# Altium footprint library 元件1.PcbLib: 420 footprints (part 8 of 27)
Each footprint in its own frame and in the unit in brackets; x right, y up, seen from the top. Pads: shape width x height; smd on the part's side, far side on the other; paste and mask are expansions set on the pad; w line width, h text height; cw(c..) or ccw(c..) is an arc to the next point about the centre after c.
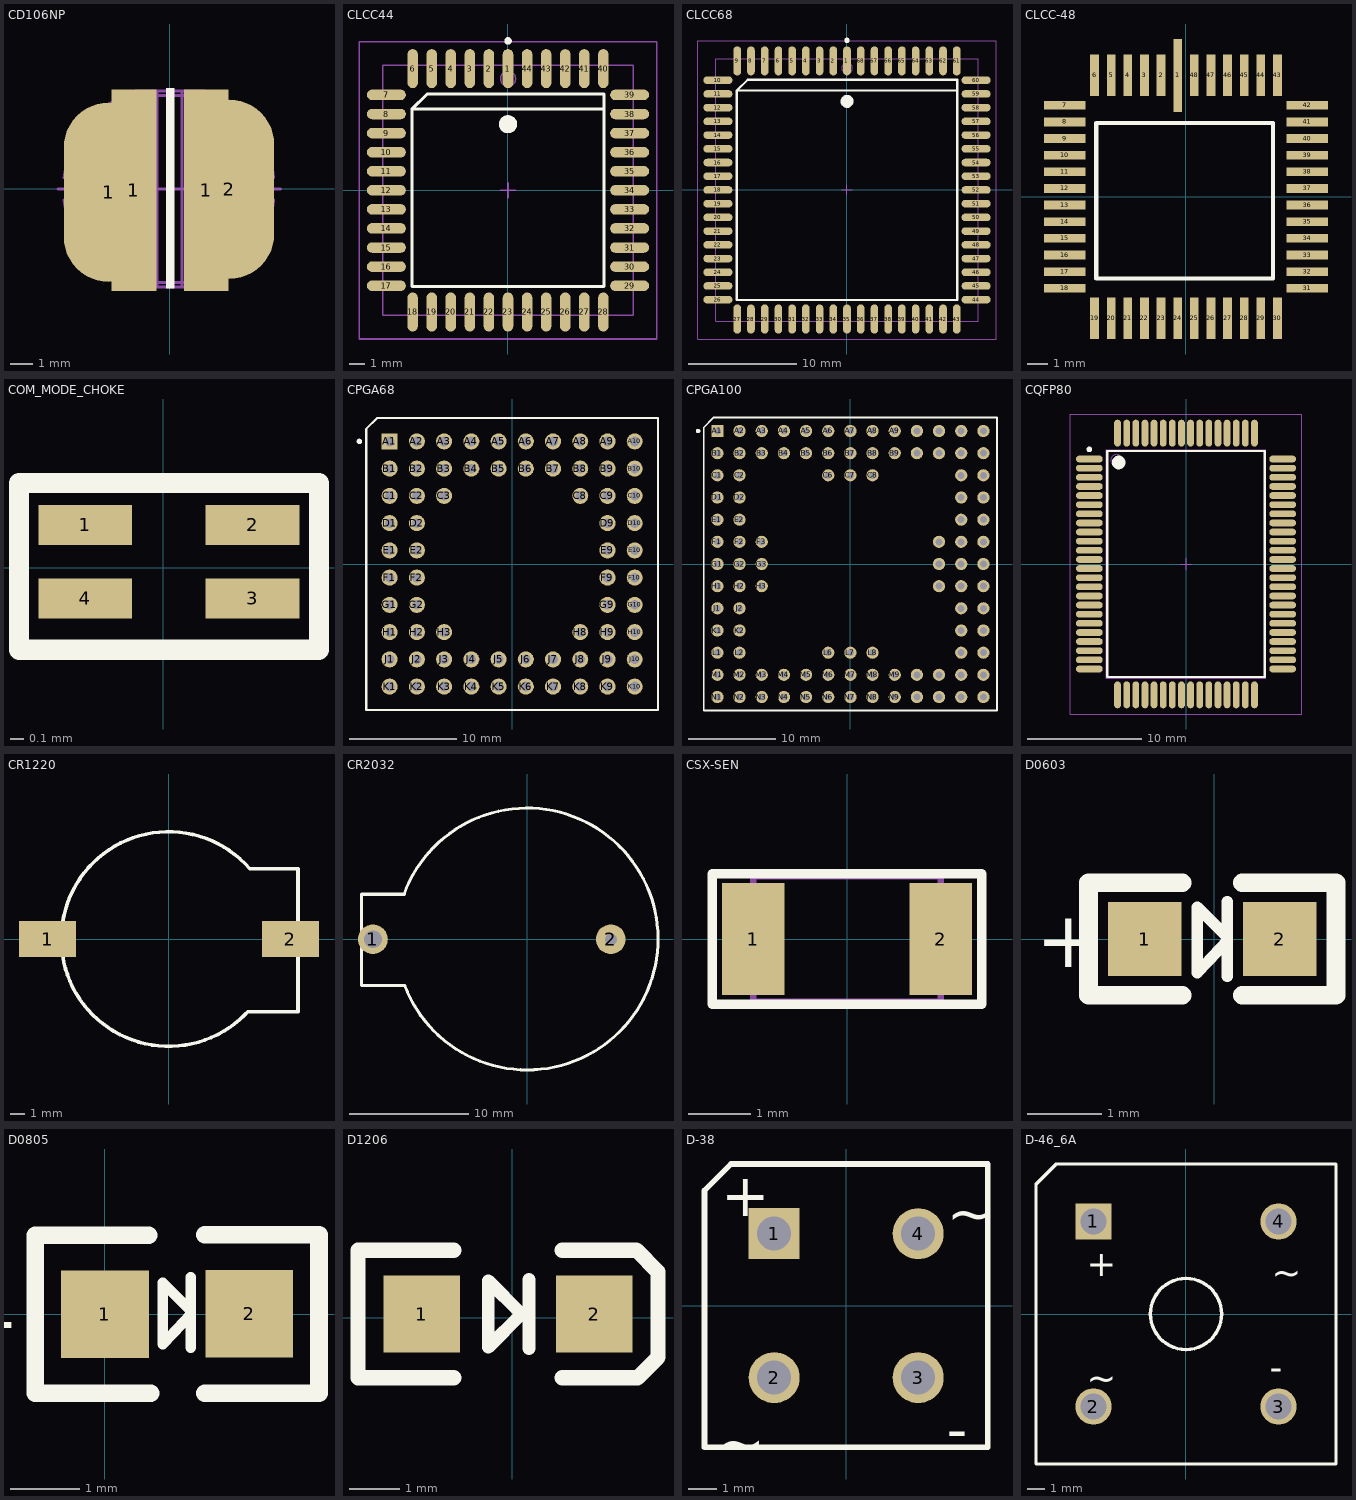
[diagram p7: the footprints below, top view; thin cyan lines are the x and y axes]

## CD106NP [mm]
pads (4):
  oval 4x8 smd mask+0: 1(-2.741,-0.165) 2(2.652,-0.031)
  rect 2x9 smd mask+0: 1(-1.613,-0.082) 1(1.615,-0.082)
Top Overlay:
  rectangle: -0.189,-4.455 0.196,4.487
Mechanical 2:
  lines w0.127: -5.002,-0.017 4.931,-0.017 ; -0.016,-4.17 -0.016,4.264 ; -4.733,-0.515 ccw(c-4.766,-0.016) -4.732,0.483 cw(c-0.018,-0.145) -1.558,4.355 1.524,4.355 cw(c-0.035,-0.079) 4.632,0.483 ccw(c4.665,-0.016) 4.633,-0.515 cw(c-0.035,0.037) 1.523,-4.398 -1.558,-4.398 cw(c-0.017,0.102) -4.733,-0.515 ; -4.508,-0.667 ccw(c-0.017,0.102) -1.524,-4.198 1.489,-4.198 ccw(c-0.035,0.037) 4.41,-0.668 cw(c4.665,-0.016) 4.408,0.635 ccw(c-0.035,-0.079) 1.489,4.155 -1.524,4.155 ccw(c-0.018,-0.145) -4.507,0.634 cw(c-4.766,-0.016) -4.508,-0.667 ; -0.569,-4.398 -0.569,4.355 0.538,4.355 0.538,-4.398 -0.569,-4.398
Mechanical 5:
  text "C10 H6.5 W9 L10" at -2.756,-5.181 h0.4
3D body "CD106.STEP": height 6.5, standoff -0.05, extent -4.671,-4.396 4.695,4.356

## CLCC44 [mm] "44-Pin Leaded Chip Carrier 1.27 mm Pitch, IPC Low Density"
height 2.87
pads (44):
  oval 0.7x2.6 smd: 1(0,8.1) 2(-1.27,8.1) 3(-2.54,8.1) 4(-3.81,8.1) 5(-5.08,8.1) 6(-6.35,8.1) 18(-6.35,-8.1) 19(-5.08,-8.1) 20(-3.81,-8.1) 21(-2.54,-8.1) 22(-1.27,-8.1) 23(0,-8.1) 24(1.27,-8.1) 25(2.54,-8.1) 26(3.81,-8.1) 27(5.08,-8.1) 28(6.35,-8.1) 40(6.35,8.1) 41(5.08,8.1) 42(3.81,8.1) 43(2.54,8.1) 44(1.27,8.1)
  oval 2.6x0.7 smd: 7(-8.1,6.35) 8(-8.1,5.08) 9(-8.1,3.81) 10(-8.1,2.54) 11(-8.1,1.27) 12(-8.1,0) 13(-8.1,-1.27) 14(-8.1,-2.54) 15(-8.1,-3.81) 16(-8.1,-5.08) 17(-8.1,-6.35) 29(8.1,-6.35) 30(8.1,-5.08) 31(8.1,-3.81) 32(8.1,-2.54) 33(8.1,-1.27) 34(8.1,0) 35(8.1,1.27) 36(8.1,2.54) 37(8.1,3.81) 38(8.1,5.08) 39(8.1,6.35)
Top Overlay:
  circle w0.6: c0,4.4 r0.3
  circle w0.25: c0,9.95 r0.125
  lines w0.2: 6.4,5.4 -6.4,5.4 ; -6.4,5.4 -6.4,-6.4 6.4,-6.4 6.4,6.4 -5.4,6.4 -6.4,5.4
Mechanical 13:
  circle w0.1: c0,7.43 r0.5
  lines w0.1: -8.33,-8.33 8.33,-8.33 8.33,8.33 -8.33,8.33 -8.33,-8.33
Mechanical 15:
  lines w0.1: -0.5,0 0.5,0 ; 0,-0.5 0,0.5 ; -9.9,-9.9 9.9,-9.9 9.9,9.9 -9.9,9.9 -9.9,-9.9
3D body "CLCC44_L.STEP": height 3.5, standoff 0.2, extent -7.973,-8.128 8.227,8.072

## CLCC68 [mm] "68-Pin Leaded Chip Carrier 1.27 mm Pitch, IPC Low Density"
height 5.08
pads (68):
  oval 0.7x2.7 smd: 1(0,11.95) 2(-1.27,11.95) 3(-2.54,11.95) 4(-3.81,11.95) 5(-5.08,11.95) 6(-6.35,11.95) 7(-7.62,11.95) 8(-8.89,11.95) 9(-10.16,11.95) 27(-10.16,-11.95) 28(-8.89,-11.95) 29(-7.62,-11.95) 30(-6.35,-11.95) 31(-5.08,-11.95) 32(-3.81,-11.95) 33(-2.54,-11.95) 34(-1.27,-11.95) 35(0,-11.95) 36(1.27,-11.95) 37(2.54,-11.95) 38(3.81,-11.95) 39(5.08,-11.95) 40(6.35,-11.95) 41(7.62,-11.95) 42(8.89,-11.95) 43(10.16,-11.95) 61(10.16,11.95) 62(8.89,11.95) 63(7.62,11.95) 64(6.35,11.95) 65(5.08,11.95) 66(3.81,11.95) 67(2.54,11.95) 68(1.27,11.95)
  oval 2.7x0.7 smd: 10(-11.95,10.16) 11(-11.95,8.89) 12(-11.95,7.62) 13(-11.95,6.35) 14(-11.95,5.08) 15(-11.95,3.81) 16(-11.95,2.54) 17(-11.95,1.27) 18(-11.95,0) 19(-11.95,-1.27) 20(-11.95,-2.54) 21(-11.95,-3.81) 22(-11.95,-5.08) 23(-11.95,-6.35) 24(-11.95,-7.62) 25(-11.95,-8.89) 26(-11.95,-10.16) 44(11.95,-10.16) 45(11.95,-8.89) 46(11.95,-7.62) 47(11.95,-6.35) 48(11.95,-5.08) 49(11.95,-3.81) 50(11.95,-2.54) 51(11.95,-1.27) 52(11.95,0) 53(11.95,1.27) 54(11.95,2.54) 55(11.95,3.81) 56(11.95,5.08) 57(11.95,6.35) 58(11.95,7.62) 59(11.95,8.89) 60(11.95,10.16)
Top Overlay:
  circle w0.25: c0,13.85 r0.125
  circle w0.6: c0,8.2 r0.3
  lines w0.2: 10.2,9.2 -10.2,9.2 ; -10.2,9.2 -9.2,10.2 10.2,10.2 10.2,-10.2 -10.2,-10.2 -10.2,9.2
Mechanical 13:
  circle w0.1: c0,11.265 r0.5
  lines w0.1: -12.165,-12.165 -12.165,12.165 12.165,12.165 12.165,-12.165 -12.165,-12.165
Mechanical 15:
  lines w0.1: -0.5,0 0.5,0 ; 0,-0.5 0,0.5 ; -13.8,-13.8 -13.8,13.8 13.8,13.8 13.8,-13.8 -13.8,-13.8
3D body "CLCC68W_L.STEP": height 3.5, standoff 0.2, extent -12,-11.938 12,12.062

## CLCC-48 [mm]
pads (48):
  rect 0.42x3.5 smd: 1(-0.4,5.84)
  rect 0.42x2 smd: 2(-1.2,5.84) 3(-2,5.84) 4(-2.8,5.84) 5(-3.6,5.84) 6(-4.4,5.84) 19(-4.4,-5.84) 20(-3.6,-5.84) 21(-2.8,-5.84) 22(-2,-5.84) 23(-1.2,-5.84) 24(-0.4,-5.84) 25(0.4,-5.84) 26(1.2,-5.84) 27(2,-5.84) 28(2.8,-5.84) 29(3.6,-5.84) 30(4.4,-5.84) 43(4.4,5.84) 44(3.6,5.84) 45(2.8,5.84) 46(2,5.84) 47(1.2,5.84) 48(0.4,5.84)
  rect 2x0.42 smd: 7(-5.84,4.4) 8(-5.84,3.6) 9(-5.84,2.8) 10(-5.84,2) 11(-5.84,1.2) 12(-5.84,0.4) 13(-5.84,-0.4) 14(-5.84,-1.2) 15(-5.84,-2) 16(-5.84,-2.8) 17(-5.84,-3.6) 18(-5.84,-4.4) 31(5.84,-4.4) 32(5.84,-3.6) 33(5.84,-2.8) 34(5.84,-2) 35(5.84,-1.2) 36(5.84,-0.4) 37(5.84,0.4) 38(5.84,1.2) 39(5.84,2) 40(5.84,2.8) 41(5.84,3.6) 42(5.84,4.4)
Top Overlay:
  lines w0.2: -4.318,-3.937 4.191,-3.937 4.191,3.556 -4.318,3.556 -4.318,-3.937
3D body "User Library-KAC-9628.STEP": height 2.21, standoff 0, extent -7.07,-6.76 7.15,7.46

## COM_MODE_CHOKE [mm]
pads (4):
  rect 0.7x0.3 smd: 1(-0.583,0.321) 2(0.666,0.321) 3(0.666,-0.229) 4(-0.583,-0.229)
Top Overlay:
  lines w0.152: -1.081,-0.614 -1.081,0.635 1.164,0.635 1.164,-0.614 -1.081,-0.614
3D body "User Library-DLP11S.STEP": height 0.82, standoff -0.03, extent -0.61,-0.46 0.69,0.54

## CPGA68 [mm] "68-Pin Pin Grid Array 2.54 mm Pitch"
height 5.47
pads (68):
  rect 1.5x1.5 hole 0.9: A1(-11.43,11.43)
  round 1.5 hole 0.9: A2(-8.89,11.43) A3(-6.35,11.43) A4(-3.81,11.43) A5(-1.27,11.43) A6(1.27,11.43) A7(3.81,11.43) A8(6.35,11.43) A9(8.89,11.43) A10(11.43,11.43) B1(-11.43,8.89) B2(-8.89,8.89) B3(-6.35,8.89) B4(-3.81,8.89) B5(-1.27,8.89) B6(1.27,8.89) B7(3.81,8.89) B8(6.35,8.89) B9(8.89,8.89) B10(11.43,8.89) C1(-11.43,6.35) C2(-8.89,6.35) C3(-6.35,6.35) C8(6.35,6.35) C9(8.89,6.35) C10(11.43,6.35) D1(-11.43,3.81) D2(-8.89,3.81) D9(8.89,3.81) D10(11.43,3.81) E1(-11.43,1.27) E2(-8.89,1.27) E9(8.89,1.27) E10(11.43,1.27) F1(-11.43,-1.27) F2(-8.89,-1.27) F9(8.89,-1.27) F10(11.43,-1.27) G1(-11.43,-3.81) G2(-8.89,-3.81) G9(8.89,-3.81) G10(11.43,-3.81) H1(-11.43,-6.35) H2(-8.89,-6.35) H3(-6.35,-6.35) H8(6.35,-6.35) H9(8.89,-6.35) H10(11.43,-6.35) J1(-11.43,-8.89) J2(-8.89,-8.89) J3(-6.35,-8.89) J4(-3.81,-8.89) J5(-1.27,-8.89) J6(1.27,-8.89) J7(3.81,-8.89) J8(6.35,-8.89) J9(8.89,-8.89) J10(11.43,-8.89) K1(-11.43,-11.43) K2(-8.89,-11.43) K3(-6.35,-11.43) K4(-3.81,-11.43) K5(-1.27,-11.43) K6(1.27,-11.43) K7(3.81,-11.43) K8(6.35,-11.43) K9(8.89,-11.43) K10(11.43,-11.43)
Top Overlay:
  circle w0.25: c-14.25,11.43 r0.125
  lines w0.2: -13.6,-13.6 -13.6,12.6 -12.6,13.6 13.6,13.6 13.6,-13.6 -13.6,-13.6
3D body "CPGA68.STEP": height 3, standoff 0, extent -13.627,-13.538 13.373,13.462

## CPGA100 [mm] "100-Pin Pin Grid Array 2.54 mm Pitch"
height 3.94
pads (100):
  rect 1.4x1.4 hole 0.8: A1(-15.24,15.24)
  round 1.4 hole 0.8: A2(-12.7,15.24) A3(-10.16,15.24) A4(-7.62,15.24) A5(-5.08,15.24) A6(-2.54,15.24) A7(0,15.24) A8(2.54,15.24) A9(5.08,15.24) A10(7.62,15.24) A11(10.16,15.24) A12(12.7,15.24) A13(15.24,15.24) B1(-15.24,12.7) B2(-12.7,12.7) B3(-10.16,12.7) B4(-7.62,12.7) B5(-5.08,12.7) B6(-2.54,12.7) B7(0,12.7) B8(2.54,12.7) B9(5.08,12.7) B10(7.62,12.7) B11(10.16,12.7) B12(12.7,12.7) B13(15.24,12.7) C1(-15.24,10.16) C2(-12.7,10.16) C6(-2.54,10.16) C7(0,10.16) C8(2.54,10.16) C12(12.7,10.16) C13(15.24,10.16) D1(-15.24,7.62) D2(-12.7,7.62) D12(12.7,7.62) D13(15.24,7.62) E1(-15.24,5.08) E2(-12.7,5.08) E12(12.7,5.08) E13(15.24,5.08) F1(-15.24,2.54) F2(-12.7,2.54) F3(-10.16,2.54) F11(10.16,2.54) F12(12.7,2.54) F13(15.24,2.54) G1(-15.24,0) G2(-12.7,0) G3(-10.16,0) G11(10.16,0) G12(12.7,0) G13(15.24,0) H1(-15.24,-2.54) H2(-12.7,-2.54) H3(-10.16,-2.54) H11(10.16,-2.54) H12(12.7,-2.54) H13(15.24,-2.54) J1(-15.24,-5.08) J2(-12.7,-5.08) J12(12.7,-5.08) J13(15.24,-5.08) K1(-15.24,-7.62) K2(-12.7,-7.62) K12(12.7,-7.62) K13(15.24,-7.62) L1(-15.24,-10.16) L2(-12.7,-10.16) L6(-2.54,-10.16) L7(0,-10.16) L8(2.54,-10.16) L12(12.7,-10.16) L13(15.24,-10.16) M1(-15.24,-12.7) M2(-12.7,-12.7) M3(-10.16,-12.7) M4(-7.62,-12.7) M5(-5.08,-12.7) M6(-2.54,-12.7) M7(0,-12.7) M8(2.54,-12.7) M9(5.08,-12.7) M10(7.62,-12.7) M11(10.16,-12.7) M12(12.7,-12.7) M13(15.24,-12.7) N1(-15.24,-15.24) N2(-12.7,-15.24) N3(-10.16,-15.24) N4(-7.62,-15.24) N5(-5.08,-15.24) N6(-2.54,-15.24) N7(0,-15.24) N8(2.54,-15.24) N9(5.08,-15.24) N10(7.62,-15.24) N11(10.16,-15.24) N12(12.7,-15.24) N13(15.24,-15.24)
Top Overlay:
  circle w0.25: c-17.45,15.24 r0.125
  lines w0.2: -16.8,-16.8 16.8,-16.8 16.8,16.8 -15.646,16.8 -16.8,15.646 -16.8,-16.8
3D body "CPGA100.STEP": height 3, standoff 0, extent -16.49,-16.627 16.51,16.373

## CQFP80 [mm] "80-Pin Ceramic Quad Flat Pack Rectangular 0.8 mm Pitch, IPC Low Density"
height 4.3
pads (80):
  oval 2.35x0.6 smd: 1(-8.475,9.2) 2(-8.475,8.4) 3(-8.475,7.6) 4(-8.475,6.8) 5(-8.475,6) 6(-8.475,5.2) 7(-8.475,4.4) 8(-8.475,3.6) 9(-8.475,2.8) 10(-8.475,2) 11(-8.475,1.2) 12(-8.475,0.4) 13(-8.475,-0.4) 14(-8.475,-1.2) 15(-8.475,-2) 16(-8.475,-2.8) 17(-8.475,-3.6) 18(-8.475,-4.4) 19(-8.475,-5.2) 20(-8.475,-6) 21(-8.475,-6.8) 22(-8.475,-7.6) 23(-8.475,-8.4) 24(-8.475,-9.2) 41(8.475,-9.2) 42(8.475,-8.4) 43(8.475,-7.6) 44(8.475,-6.8) 45(8.475,-6) 46(8.475,-5.2) 47(8.475,-4.4) 48(8.475,-3.6) 49(8.475,-2.8) 50(8.475,-2) 51(8.475,-1.2) 52(8.475,-0.4) 53(8.475,0.4) 54(8.475,1.2) 55(8.475,2) 56(8.475,2.8) 57(8.475,3.6) 58(8.475,4.4) 59(8.475,5.2) 60(8.475,6) 61(8.475,6.8) 62(8.475,7.6) 63(8.475,8.4) 64(8.475,9.2)
  oval 0.6x2.35 smd: 25(-6,-11.475) 26(-5.2,-11.475) 27(-4.4,-11.475) 28(-3.6,-11.475) 29(-2.8,-11.475) 30(-2,-11.475) 31(-1.2,-11.475) 32(-0.4,-11.475) 33(0.4,-11.475) 34(1.2,-11.475) 35(2,-11.475) 36(2.8,-11.475) 37(3.6,-11.475) 38(4.4,-11.475) 39(5.2,-11.475) 40(6,-11.475) 65(6,11.475) 66(5.2,11.475) 67(4.4,11.475) 68(3.6,11.475) 69(2.8,11.475) 70(2,11.475) 71(1.2,11.475) 72(0.4,11.475) 73(-0.4,11.475) 74(-1.2,11.475) 75(-2,11.475) 76(-2.8,11.475) 77(-3.6,11.475) 78(-4.4,11.475) 79(-5.2,11.475) 80(-6,11.475)
Top Overlay:
  circle w0.25: c-8.475,10.05 r0.125
  circle w0.6: c-5.9,8.9 r0.3
  lines w0.2: -6.9,-9.9 -6.9,9.9 6.9,9.9 6.9,-9.9 -6.9,-9.9
Mechanical 13:
  circle w0.1: c-6.1,9.1 r0.5
  lines w0.1: -7,-10 -7,10 7,10 7,-10 -7,-10
Mechanical 15:
  lines w0.1: -0.5,0 0.5,0 ; 0,-0.5 0,0.5 ; -10.15,-13.15 -10.15,13.15 10.15,13.15 10.15,-13.15 -10.15,-13.15
3D body "CQFP080_L.STEP": height 3, standoff -0.1, extent -8.527,-11.43 8.273,11.37

## CR1220 [mm]
pads (2):
  rect 4x2.5 smd: 1(-8.458,0) 2(8.509,0)
Top Overlay:
  lines w0.254: 5.303,-5.303 cw(c0,0) 5.671,4.908 ; 5.334,-5.283 5.537,-5.08 8.865,-5.08 9.042,-5.08 9.042,4.902 5.69,4.902
3D body "cr1220smd.STEP": height 4.94, standoff 0, extent -8.996,-7.62 9.504,7.377

## CR2032 [mm] "锂电池座"
pads (2):
  round 2.5 hole 1.5: 1(-12.954,-0.025)
  round 2.5 hole 1: 2(7.036,-0.025)
Top Overlay:
  lines w0.254: -10.324,3.798 cw(c0,0) -10.279,-3.918 ; -10.312,3.759 -13.919,3.759 -13.919,-3.912 -10.236,-3.912
3D body "CR2032.step": height 9.17, standoff -3, extent -15.652,-11.474 11.779,11.526

## CSX-SEN [mm]
height 0.051
pads (2):
  rect 1x1.8 smd: 1(-1.5,0) 2(1.5,0)
Top Overlay:
  lines w0.152: -2.159,-1.041 2.159,-1.041 2.159,1.041 -2.159,1.041 -2.159,-1.041
Mechanical 13:
  lines w0.1: -1.5,-1 1.5,-1 1.5,1 -1.5,1 -1.5,-1
3D body "CSX-SEN.STEP": height 1.8, standoff 0, extent -1.5,-0.9 1.5,0.9

## D0603 [mm]
pads (2):
  rect 1x1 smd: 1(-0.94,0) 2(0.889,0)
Top Overlay:
  lines w0.152: 0.178,-0.508 0.178,0.508 ; 0.178,-0.025 -0.229,-0.457 -0.229,0.432 0.178,0.025
  lines w0.254: -0.432,-0.762 -1.702,-0.762 -1.702,0.762 -0.432,0.762 ; 0.381,-0.762 1.651,-0.762 1.651,0.762 0.381,0.762
  text "+" at -2.413,-0.381 h0.76
3D body: height 0.46, standoff 0, extent -0.28,-0.279 0.255,0.279
3D body: height 0.38, standoff 0, extent -0.603,-0.533 0.567,0.533
3D body: height 0.38, standoff 0, extent -1.026,-0.535 -0.602,0.535
3D body: height 0.38, standoff 0, extent 0.563,-0.532 0.988,0.532

## D0805 [mm] "1/8W"
pads (2):
  rect 1.27x1.27 smd: 1(0,0) 2(2.09,0.005)
Top Overlay:
  lines w0.152: 1.245,-0.483 1.245,0.533 ; 1.245,0 0.838,-0.432 0.838,0.457 1.245,0.051
  lines w0.254: 0.635,1.143 -1.011,1.143 -1.011,-1.143 0.66,-1.143 ; 1.448,-1.143 3.099,-1.143 3.099,1.148 1.448,1.148
  text "+" at -1.245,-0.483 h0.76
3D body "R0805.STEP": height 0.55, standoff 0, extent 0.036,-0.62 2.036,0.64
3D body: height 0.46, standoff 0, extent 0.787,-0.254 1.322,0.305

## D1206 [mil] "1/4W"
pads (2):
  rect 60x60 smd: 1(-71,3) 2(64,3)
Top Overlay:
  lines w10: 13,-24 13,30 ; -19,-23 -19,-12 -19,29 7,3 -19,-23
  lines w12: -46,-47 -121,-47 -121,53 -46,53 ; 39,-47 98,-47 114,-31 114,36 97,53 39,53
3D body "SOD-80.STEP": height 59.06, standoff 0, extent -72.9,-26.53 64.9,32.53

## D-38 [mm] "Bridge Rectifier; 4 Terminals; Body 9.4 x 9.4 mm (typ); Pitch 5.08 mm"
height 9.91
pads (4):
  rect 1.8x1.8 hole 1.2: 1(-2.54,2.54)
  round 1.8 hole 1.2: 2(-2.54,-2.54) 3(2.54,-2.54) 4(2.54,2.54)
Top Overlay:
  lines w0.2: -5,-5 5,-5 5,5 -4.064,5 -5,4.064 -5,-5
  text "~" at 3.556,2.54 h1.5
  text "~" at -4.572,-5.588 h1.5
  text "-" at 3.556,-5.08 h1.5
  text "+" at -4.41,3.164 h1.5
3D body "D-38.STEP": height 3.1, standoff 0, extent -4.978,-5.105 5.022,4.895

## D-46_6A [mm] "Bridge Rectifier; 4 Terminals; Body 16.8 x 16.8 mm (typ); Pitch 10.67 mm"
height 6.35
pads (4):
  rect 2.1x2.1 hole 1.5: 1(-5.335,5.335)
  round 2.1 hole 1.5: 2(-5.335,-5.335) 3(5.335,-5.335) 4(5.335,5.335)
Top Overlay:
  circle w0.2: c0,0 r2.05
  lines w0.2: -8.65,-8.65 8.65,-8.65 8.65,8.65 -7.474,8.65 -8.65,7.474 -8.65,-8.65
  text "~" at -5.723,-4.437 h1.5
  text "~" at 4.945,1.659 h1.5
  text "-" at 4.825,-3.809 h1.5
  text "+" at -5.723,2.167 h1.5
3D body "D-46_6A.STEP": height 3.1, standoff 0, extent -8.466,-8.449 8.534,8.551